# Altium footprint library SMotlaq-PCB_lib.PcbLib: 186 footprints (part 5 of 12)
Each footprint in its own frame and in the unit in brackets; x right, y up, seen from the top. Pads: shape width x height; smd on the part's side, far side on the other; paste and mask are expansions set on the pad; w line width, h text height; cw(c..) or ccw(c..) is an arc to the next point about the centre after c.
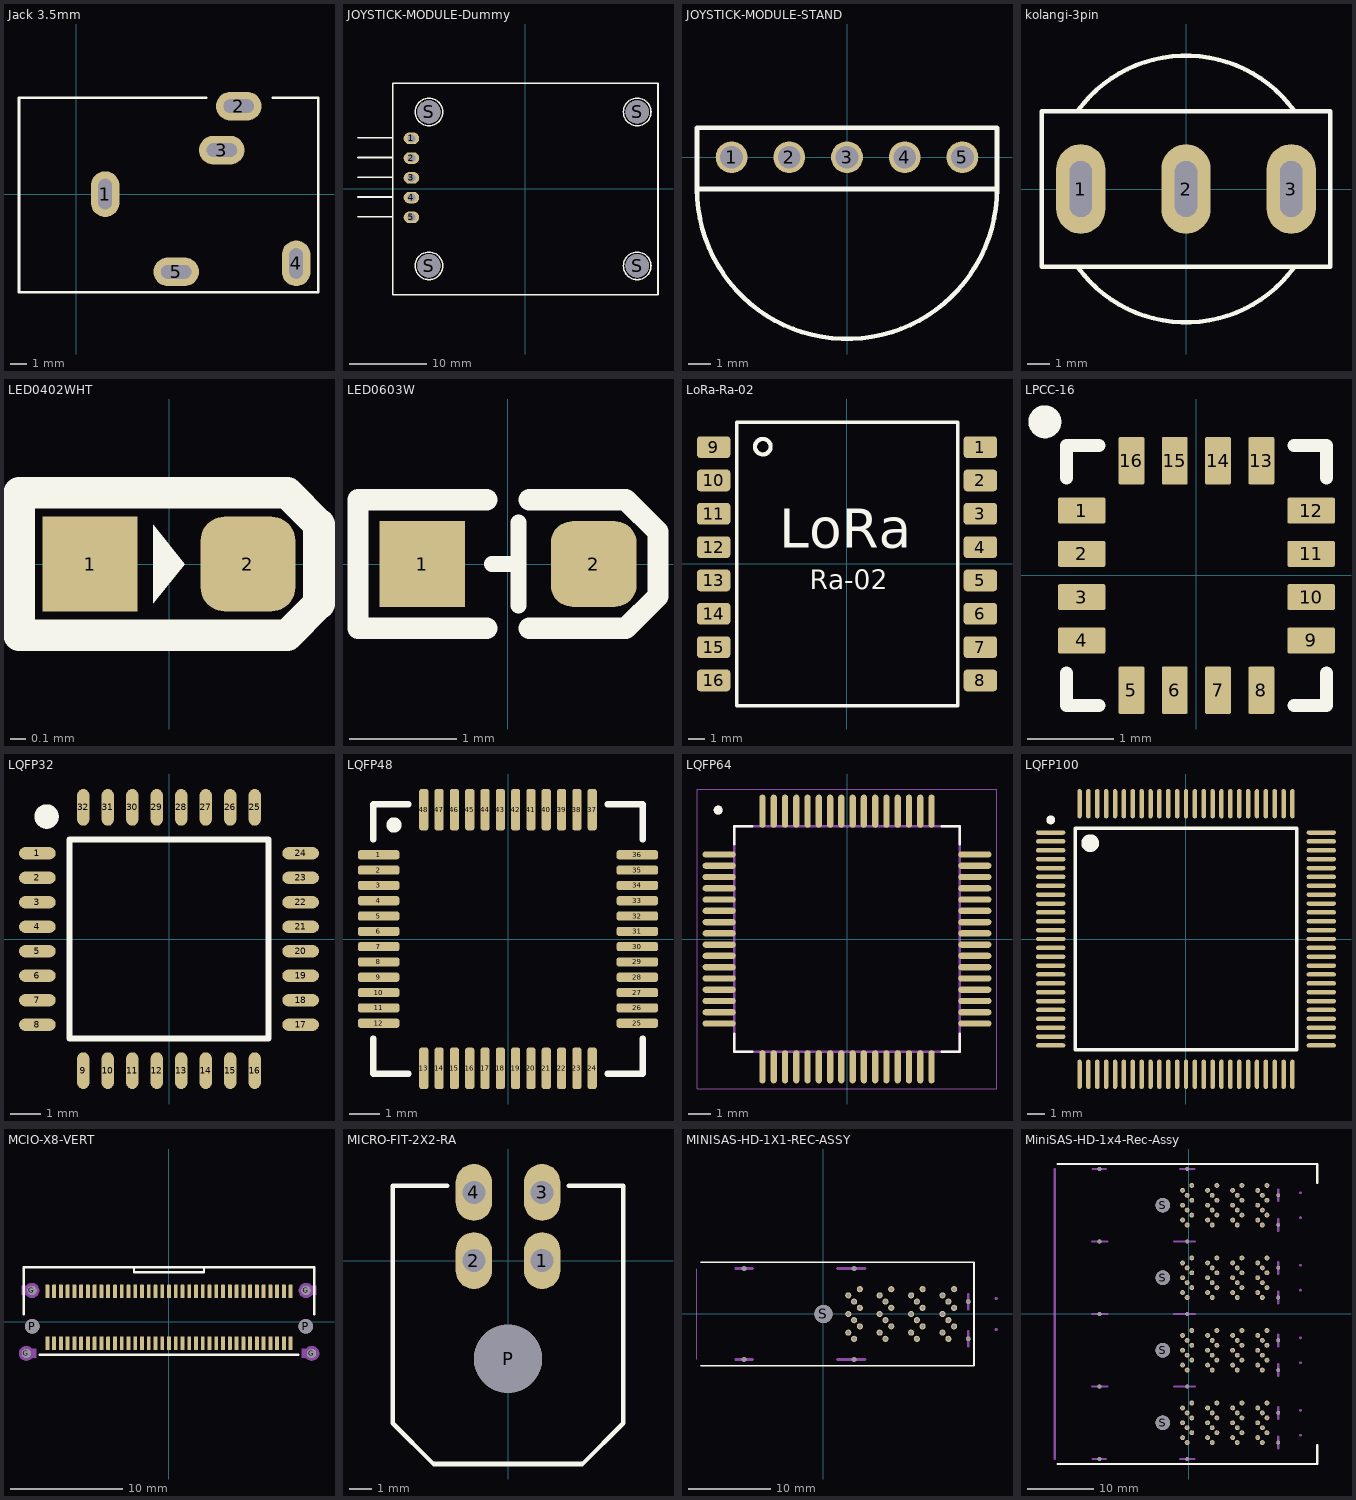
[diagram p4: the footprints below, top view; thin cyan lines are the x and y axes]

## Jack 3.5mm [mm]
pads (5):
  oval 1.7x2.7 hole 1.8 slot 0.8 at 0 deg: 1(1.7,0) 4(13,-4.1)
  oval 2.7x1.7 hole 1.8 slot 0.8 at 90 deg: 2(9.6,5.2) 3(8.6,2.6) 5(5.9,-4.6)
Top Overlay:
  lines w0.15: 7.675,5.7 -3.4,5.7 -3.4,-5.8 14.3,-5.8 14.3,5.7 11.625,5.7
3D body "User Library-StereoJack_3_5mm_Disi.step": height 6, standoff -3.2, extent -3.4,-5.8 14.3,5.7

## JOYSTICK-MODULE-Dummy [mm]
pads (9):
  oval 2x1.5 hole 1: 1(-14.65,6.5) 2(-14.65,3.96) 3(-14.65,1.42) 4(-14.65,-1.12) 5(-14.65,-3.66)
  round 3 hole 3 unplated: S(-12.4,-9.9) S(-12.4,9.9) S(14.4,-9.9) S(14.4,9.9)
Top Overlay:
  circle w0.2: c-12.4,-9.9 r1.773
  circle w0.2: c14.4,-9.9 r1.773
  circle w0.2: c14.4,9.9 r1.773
  circle w0.2: c-12.4,9.9 r1.773
  lines w0.2: -21.525,-3.58 -17.075,-3.58 ; -21.525,-1.04 -17.075,-1.04 ; -21.525,1.5 -17.075,1.5 ; -21.525,4.04 -17.075,4.04 ; -21.525,6.58 -17.075,6.58 ; -17.075,-13.6 -17.075,13.575 17.075,13.575 17.075,-13.6 -17.075,-13.6
3D body "Joystick HW504 Board.x_t": height 32.02, standoff 0, extent -22.5,-13.5 17,14

## JOYSTICK-MODULE-STAND [mm]
pads (5):
  round 1.4 / inner round 1.4 / far side rect 1.4x2.2 hole 1 mask+0.1: 1(-5.08,0)
  round 1.4 / inner round 1.4 / far side oval 1.4x2.2 hole 1 mask+0.1: 2(-2.54,0) 3(0,0) 4(2.54,0) 5(5.08,0)
Top Overlay:
  lines w0.2: -6.6,-1.4 ccw(c0,-1.4) 6.6,-1.4 ; -6.6,-1.4 -6.6,1.3 6.6,1.3 6.6,-1.4 ; -6.6,-1.4 6.6,-1.4
3D body "Joystick HW504 Board.x_t": height 42, standoff 2.5, extent -12.45,-26.249 15.05,5.775
3D body "female_header_a-bl254-eg-g02d.stp": height 8.5, standoff -3.2, extent 1.145,-1.3 6.475,1.2
3D body "female_header_a-bl254-eg-g03d.stp": height 8.5, standoff -3.2, extent -6.475,-1.3 1.395,1.2

## kolangi-3pin [mm]
pads (3):
  rrect100% 2.2x4 hole 1 slot 2.5 at 90 deg mask+0.075: 1(-4.7,0) 2(0,0) 3(4.7,0)
Top Overlay:
  lines w0.2: -4.822,-3.503 ccw(c0,0) 4.822,-3.503 ; -4.822,3.503 cw(c0,0) 4.822,3.503 ; -6.45,-3.475 -6.45,3.475 6.45,3.475 6.45,-3.475 -6.45,-3.475
3D body "User Library-SWITCH SPDT_O_N_O.STEP": height 28.89, standoff -2.17, extent -6.35,-5.968 6.35,5.968

## LED0402WHT [mm] "LED SMD 0402, WHITE"
pads (2):
  rect 0.6x0.6 smd paste-2 mask+0.075: 1(-0.5,0)
  rrect50% 0.6x0.6 smd paste-2 mask+0.075: 2(0.5,0)
Top Overlay:
  region: -0.1,0.25 -0.1,-0.25 0.1,0
  lines w0.2: -0.95,-0.45 -0.95,0.45 0.75,0.45 0.95,0.25 0.95,-0.25 0.75,-0.45 -0.95,-0.45
Top Paste:
  region: -0.3,0 -0.3,-0.05 -0.338,-0.142 -0.408,-0.212 -0.5,-0.25 -0.55,-0.25 -0.7,-0.25 -0.7,0.25 -0.55,0.25 -0.5,0.25 -0.408,0.212 -0.338,0.142 -0.3,0.05
  region: 0.3,0 0.3,-0.05 0.338,-0.142 0.408,-0.212 0.5,-0.25 0.55,-0.25 0.7,-0.25 0.7,0.25 0.55,0.25 0.5,0.25 0.408,0.212 0.338,0.142 0.3,0.05
3D body "LED_1006_W.STEP": height 0.2, standoff 0, extent -0.5,-0.3 0.5,0.3

## LED0603W [mm]
pads (2):
  rect 0.8x0.8 smd paste-5 mask+0.075: 1(-0.8,0)
  rrect50% 0.8x0.8 smd paste-5 mask+0.075: 2(0.8,0)
Top Overlay:
  lines w0.15: -0.15,0 0.1,0 ; 0.1,-0.387 0.1,0.387
  lines w0.2: -0.2,-0.6 -1.4,-0.6 -1.4,0.6 -0.2,0.6 ; 0.2,-0.6 1.1,-0.6 1.4,-0.3 1.4,0.3 1.1,0.6 0.2,0.6
Top Paste:
  region: 0.75,0.35 0.68,0.35 0.552,0.297 0.453,0.198 0.4,0.07 0.4,0 0.4,-0.07 0.453,-0.198 0.552,-0.297 0.68,-0.35 0.75,-0.35 0.95,-0.35 0.98,-0.35 1.035,-0.327 1.077,-0.285 1.1,-0.23 1.1,-0.2 1.1,0.2 1.1,0.23 1.077,0.285 1.035,0.327 0.98,0.35 0.95,0.35
  region: -0.75,0.35 -0.68,0.35 -0.552,0.297 -0.453,0.198 -0.4,0.07 -0.4,0 -0.4,-0.07 -0.453,-0.198 -0.552,-0.297 -0.68,-0.35 -0.75,-0.35 -0.95,-0.35 -0.98,-0.35 -1.035,-0.327 -1.077,-0.285 -1.1,-0.23 -1.1,-0.2 -1.1,0.2 -1.1,0.23 -1.077,0.285 -1.035,0.327 -0.98,0.35 -0.95,0.35
3D body: height 0.4, standoff 0, extent 0.6,-0.4 0.8,0.4
3D body: height 0.4, standoff 0, extent -0.8,-0.4 -0.6,0.4
3D body: height 0.4, standoff 0, extent -0.6,-0.4 0.6,0.4
3D body: height 0.5, standoff 0, extent -0.4,-0.3 0.4,0.3

## LoRa-Ra-02 [mm]
pads (16):
  rrect30% 2x1.3 smd: 1(8,7) 2(8,5) 3(8,3) 4(8,1) 5(8,-1) 6(8,-3) 7(8,-5) 8(8,-7) 9(-8,7) 10(-8,5) 11(-8,3) 12(-8,1) 13(-8,-1) 14(-8,-3) 15(-8,-5) 16(-8,-7)
Top Overlay:
  circle w0.254: c-5.05,7.025 r0.465
  lines w0.2: -6.625,-8.525 -6.625,8.5 6.65,8.5 6.65,-8.525 -6.625,-8.525
  text "Ra-02" at -2.25,-1.928 h2
  text "LoRa" at -4.05,0.191 h4
3D body "User Library-RA-02-2.STEP": height 3.2, standoff 0, extent -8,-8.5 8,8.5

## LPCC-16 [mm]
pads (16):
  rrect15% 0.55x0.3 smd: 1(-1.325,0.75) 2(-1.325,0.25) 3(-1.325,-0.25) 4(-1.325,-0.75) 9(1.325,-0.75) 10(1.325,-0.25) 11(1.325,0.25) 12(1.325,0.75)
  rrect15% 0.3x0.55 smd: 5(-0.75,-1.325) 6(-0.25,-1.325) 7(0.25,-1.325) 8(0.75,-1.325) 13(0.75,1.325) 14(0.25,1.325) 15(-0.25,1.325) 16(-0.75,1.325)
Top Overlay:
  circle w0.2: c-1.75,1.775 r0.09
  lines w0.15: -1.5,-1.125 -1.5,-1.5 -1.125,-1.5 ; -1.5,1.125 -1.5,1.5 -1.125,1.5 ; 1.125,-1.5 1.5,-1.5 1.5,-1.125 ; 1.125,1.5 1.5,1.5 1.5,1.125
3D body "User Library-LPCC 16.step": height 0.9, standoff 0, extent -1.5,-1.5 1.5,1.5

## LQFP32 [mm]
pads (32):
  rrect100% 1.2x0.4 smd: 1(-4.3,2.8) 2(-4.3,2) 3(-4.3,1.2) 4(-4.3,0.4) 5(-4.3,-0.4) 6(-4.3,-1.2) 7(-4.3,-2) 8(-4.3,-2.8) 17(4.3,-2.8) 18(4.3,-2) 19(4.3,-1.2) 20(4.3,-0.4) 21(4.3,0.4) 22(4.3,1.2) 23(4.3,2) 24(4.3,2.8)
  rrect100% 0.4x1.2 smd: 9(-2.8,-4.3) 10(-2,-4.3) 11(-1.2,-4.3) 12(-0.4,-4.3) 13(0.4,-4.3) 14(1.2,-4.3) 15(2,-4.3) 16(2.8,-4.3) 25(2.8,4.3) 26(2,4.3) 27(1.2,4.3) 28(0.4,4.3) 29(-0.4,4.3) 30(-1.2,4.3) 31(-2,4.3) 32(-2.8,4.3)
Top Overlay:
  circle w0.4: c-4,4 r0.2
  lines w0.2: -3.25,-3.25 3.25,-3.25 3.25,3.25 -3.25,3.25 -3.25,-3.25
3D body "User Library-LQFP32-0_8.step": height 1.65, standoff -0.01, extent -4.519,-4.519 4.519,4.519

## LQFP48 [mm]
pads (48):
  rrect50% 1.35x0.3 smd mask+0.1: 1(-4.225,2.75) 2(-4.225,2.25) 3(-4.225,1.75) 4(-4.225,1.25) 5(-4.225,0.75) 6(-4.225,0.25) 7(-4.225,-0.25) 8(-4.225,-0.75) 9(-4.225,-1.25) 10(-4.225,-1.75) 11(-4.225,-2.25) 12(-4.225,-2.75) 25(4.225,-2.75) 26(4.225,-2.25) 27(4.225,-1.75) 28(4.225,-1.25) 29(4.225,-0.75) 30(4.225,-0.25) 31(4.225,0.25) 32(4.225,0.75) 33(4.225,1.25) 34(4.225,1.75) 35(4.225,2.25) 36(4.225,2.75)
  rrect50% 0.3x1.35 smd mask+0.1: 13(-2.75,-4.225) 14(-2.25,-4.225) 15(-1.75,-4.225) 16(-1.25,-4.225) 17(-0.75,-4.225) 18(-0.25,-4.225) 19(0.25,-4.225) 20(0.75,-4.225) 21(1.25,-4.225) 22(1.75,-4.225) 23(2.25,-4.225) 24(2.75,-4.225) 37(2.75,4.225) 38(2.25,4.225) 39(1.75,4.225) 40(1.25,4.225) 41(0.75,4.225) 42(0.25,4.225) 43(-0.25,4.225) 44(-0.75,4.225) 45(-1.25,4.225) 46(-1.75,4.225) 47(-2.25,4.225) 48(-2.75,4.225)
Top Overlay:
  circle w0.3: c-3.725,3.725 r0.1
  lines w0.2: -4.4,-3.25 -4.4,-4.4 -3.25,-4.4 ; -4.4,3.25 -4.4,4.4 -3.25,4.4 ; 3.25,-4.4 4.4,-4.4 4.4,-3.25 ; 3.25,4.4 4.4,4.4 4.4,3.25
3D body "User Library-LQFP48-0_5.step": height 1.55, standoff -0.02, extent -4.386,-4.386 4.386,4.386

## LQFP64 [mm]
pads (64):
  rrect100% 1.47x0.28 smd: 1(-5.67,3.75) 2(-5.67,3.25) 3(-5.67,2.75) 4(-5.67,2.25) 5(-5.67,1.75) 6(-5.67,1.25) 7(-5.67,0.75) 8(-5.67,0.25) 9(-5.67,-0.25) 10(-5.67,-0.75) 11(-5.67,-1.25) 12(-5.67,-1.75) 13(-5.67,-2.25) 14(-5.67,-2.75) 15(-5.67,-3.25) 16(-5.67,-3.75) 33(5.67,-3.75) 34(5.67,-3.25) 35(5.67,-2.75) 36(5.67,-2.25) 37(5.67,-1.75) 38(5.67,-1.25) 39(5.67,-0.75) 40(5.67,-0.25) 41(5.67,0.25) 42(5.67,0.75) 43(5.67,1.25) 44(5.67,1.75) 45(5.67,2.25) 46(5.67,2.75) 47(5.67,3.25) 48(5.67,3.75)
  rrect100% 0.28x1.47 smd: 17(-3.75,-5.67) 18(-3.25,-5.67) 19(-2.75,-5.67) 20(-2.25,-5.67) 21(-1.75,-5.67) 22(-1.25,-5.67) 23(-0.75,-5.67) 24(-0.25,-5.67) 25(0.25,-5.67) 26(0.75,-5.67) 27(1.25,-5.67) 28(1.75,-5.67) 29(2.25,-5.67) 30(2.75,-5.67) 31(3.25,-5.67) 32(3.75,-5.67) 49(3.75,5.67) 50(3.25,5.67) 51(2.75,5.67) 52(2.25,5.67) 53(1.75,5.67) 54(1.25,5.67) 55(0.75,5.67) 56(0.25,5.67) 57(-0.25,5.67) 58(-0.75,5.67) 59(-1.25,5.67) 60(-1.75,5.67) 61(-2.25,5.67) 62(-2.75,5.67) 63(-3.25,5.67) 64(-3.75,5.67)
Top Overlay:
  circle w0.2: c-5.715,5.715 r0.1
  lines w0.127: -5,-4.21 -5,-5 -4.21,-5 ; -5,4.21 -5,5 -4.21,5 ; 4.21,-5 5,-5 5,-4.21 ; 4.21,5 5,5 5,4.21
Mechanical 13:
  circle w0.2: c-5.715,5.715 r0.1
  lines w0.127: -5,-5 -5,5 5,5 5,-5 -5,-5
Mechanical 15:
  lines w0.05: -6.655,-6.655 -6.655,6.655 6.655,6.655 6.655,-6.655 -6.655,-6.655
3D body "User Library-STM32Fxxx -LQFP64 10mm x 10mm.step": height 1.6, standoff 0.01, extent -5.999,-5.999 5.999,5.999

## LQFP100 [mm]
pads (100):
  rrect100% 1.655x0.252 smd paste+0: 1(-7.618,6.002) 2(-7.618,5.502) 3(-7.618,5.002) 4(-7.618,4.502) 5(-7.618,4.002) 6(-7.618,3.502) 7(-7.618,3.002) 8(-7.618,2.502) 9(-7.618,2.002) 10(-7.618,1.502) 11(-7.618,1.002) 12(-7.618,0.502) 13(-7.618,0.002) 14(-7.618,-0.498) 15(-7.618,-0.998) 16(-7.618,-1.498) 17(-7.618,-1.998) 18(-7.618,-2.498) 19(-7.618,-2.998) 20(-7.618,-3.498) 21(-7.618,-3.998) 22(-7.618,-4.498) 23(-7.618,-4.998) 24(-7.618,-5.498) 25(-7.618,-5.998) 51(7.633,-5.998) 52(7.633,-5.498) 53(7.633,-4.998) 54(7.633,-4.498) 55(7.633,-3.998) 56(7.633,-3.498) 57(7.633,-2.998) 58(7.633,-2.498) 59(7.633,-1.998) 60(7.633,-1.498) 61(7.633,-0.998) 62(7.633,-0.498) 63(7.633,0.002) 64(7.633,0.502) 65(7.633,1.002) 66(7.633,1.502) 67(7.633,2.002) 68(7.633,2.502) 69(7.633,3.002) 70(7.633,3.502) 71(7.633,4.002) 72(7.633,4.502) 73(7.633,5.002) 74(7.633,5.502) 75(7.633,6.002)
  rrect100% 0.252x1.655 smd paste+0: 26(-5.992,-7.623) 27(-5.492,-7.623) 28(-4.992,-7.623) 29(-4.492,-7.623) 30(-3.992,-7.623) 31(-3.492,-7.623) 32(-2.992,-7.623) 33(-2.492,-7.623) 34(-1.992,-7.623) 35(-1.492,-7.623) 36(-0.992,-7.623) 37(-0.492,-7.623) 38(0.008,-7.623) 39(0.508,-7.623) 40(1.008,-7.623) 41(1.508,-7.623) 42(2.008,-7.623) 43(2.508,-7.623) 44(3.008,-7.623) 45(3.508,-7.623) 46(4.008,-7.623) 47(4.508,-7.623) 48(5.008,-7.623) 49(5.508,-7.623) 50(6.008,-7.623) 76(6.008,7.628) 77(5.508,7.628) 78(5.008,7.628) 79(4.508,7.628) 80(4.008,7.628) 81(3.508,7.628) 82(3.008,7.628) 83(2.508,7.628) 84(2.008,7.628) 85(1.508,7.628) 86(1.008,7.628) 87(0.508,7.628) 88(0.008,7.628) 89(-0.492,7.628) 90(-0.992,7.628) 91(-1.492,7.628) 92(-1.992,7.628) 93(-2.492,7.628) 94(-2.992,7.628) 95(-3.492,7.628) 96(-3.992,7.628) 97(-4.492,7.628) 98(-4.992,7.628) 99(-5.492,7.628) 100(-5.992,7.628)
Top Overlay:
  circle w0.5: c-5.392,5.402 r0.25
  circle w0.25: c-7.618,6.712 r0.125
  lines w0.2: -6.242,-6.248 -6.242,6.252 6.258,6.252 6.258,-6.248 -6.242,-6.248
3D body "IC_STMicroelectronics_STM32L496VGT6_eec.STEP": height 1.6, standoff 0, extent -7.992,-7.998 8.008,8.002

## MCIO-X8-VERT [mm]
pads (80):
  rrect20% 0.35x1.2 smd mask+0.1: A1(-10.8,-1.895) A2(-10.2,-1.895) A3(-9.6,-1.895) A4(-9,-1.895) A5(-8.4,-1.895) A6(-7.8,-1.895) A7(-7.2,-1.895) A8(-6.6,-1.895) A9(-6,-1.895) A10(-5.4,-1.895) A11(-4.8,-1.895) A12(-4.2,-1.895) A13(-3.6,-1.895) A14(-3,-1.895) A15(-2.4,-1.895) A16(-1.8,-1.895) A17(-1.2,-1.895) A18(-0.6,-1.895) A19(0,-1.895) A20(0.6,-1.895) A21(1.2,-1.895) A22(1.8,-1.895) A23(2.4,-1.895) A24(3,-1.895) A25(3.6,-1.895) A26(4.2,-1.895) A27(4.8,-1.895) A28(5.4,-1.895) A29(6,-1.895) A30(6.6,-1.895) A31(7.2,-1.895) A32(7.8,-1.895) A33(8.4,-1.895) A34(9,-1.895) A35(9.6,-1.895) A36(10.2,-1.895) A37(10.8,-1.895) B1(-10.8,2.705) B2(-10.2,2.705) B3(-9.6,2.705) B4(-9,2.705) B5(-8.4,2.705) B6(-7.8,2.705) B7(-7.2,2.705) B8(-6.6,2.705) B9(-6,2.705) B10(-5.4,2.705) B11(-4.8,2.705) B12(-4.2,2.705) B13(-3.6,2.705) B14(-3,2.705) B15(-2.4,2.705) B16(-1.8,2.705) B17(-1.2,2.705) B18(-0.6,2.705) B19(0,2.705) B20(0.6,2.705) B21(1.2,2.705) B22(1.8,2.705) B23(2.4,2.705) B24(3,2.705) B25(3.6,2.705) B26(4.2,2.705) B27(4.8,2.705) B28(5.4,2.705) B29(6,2.705) B30(6.6,2.705) B31(7.2,2.705) B32(7.8,2.705) B33(8.4,2.705) B34(9,2.705) B35(9.6,2.705) B36(10.2,2.705) B37(10.8,2.705)
  round 0.8 hole 0.8 unplated mask+0.1: G(-12.675,-2.795) G(-12.175,2.795) G(12.175,2.795) G(12.675,-2.795)
  round 1.3 hole 1.3 unplated mask+0.1: P(-12.15,-0.395) P(12.15,-0.395)
Top Overlay:
  lines w0.2: -12.9,0.655 -12.9,4.855 12.9,4.855 12.9,0.655 ; -11.5,-2.92 11.5,-2.92 ; -3.1,4.855 -3.1,4.405 0,4.405 3.1,4.405 3.1,4.855
Mechanical 29:
  drawing of 12 lines, arcs and shapes, not listed
3D body "g97vx2x1xhr.stp": height 8.95, standoff -1.95, extent -12.9,-2.93 12.9,4.84

## MICRO-FIT-2X2-RA [mm]
height 8.77
pads (5):
  oval 1.6x2.5 hole 1.02 mask+0.1: 1(1.5,0) 2(-1.5,0) 3(1.5,3) 4(-1.5,3)
  round 3 hole 3 unplated mask+0.1: P(0,-4.32)
Top Overlay:
  lines w0.2: -2.675,3.3 -5.075,3.3 -5.075,-7.15 -3.275,-8.95 3.275,-8.95 5.075,-7.15 5.075,3.3 2.675,3.3
3D body "0430450400.stp": height 8.83, standoff -3.12, extent -5.075,-8.955 5.075,3.285

## MINISAS-HD-1X1-REC-ASSY [mm]
pads (43):
  round 0.74 hole 0.457 mask+0.05: A1(4.4,3) A2(3,2.25) A3(3.7,1.5) A4(4.4,0.75) A5(3,0) A6(3.7,-0.75) A7(4.4,-1.5) A8(3,-2.25) A9(3.7,-3) B1(8.2,3) B2(6.8,2.25) B3(7.5,1.5) B4(8.2,0.75) B5(6.8,0) B6(7.5,-0.75) B7(8.2,-1.5) B8(6.8,-2.25) B9(7.5,-3) C1(12,3) C2(10.6,2.25) C3(11.3,1.5) C4(12,0.75) C5(10.6,0) C6(11.3,-0.75) C7(12,-1.5) C8(10.6,-2.25) C9(11.3,-3) D1(15.8,3) D2(14.4,2.25) D3(15.1,1.5) D4(15.8,0.75) D5(14.4,0) D6(15.1,-0.75) D7(15.8,-1.5) D8(14.4,-2.25) D9(15.1,-3)
  round 0.57 hole 0.57 mask+0.1: P(-9.61,-5.5) P(-9.61,5.5) P(3.7,-5.5) P(3.7,5.5) P(17.51,-3) P(17.51,1.5)
  round 2.2 hole 2.2 unplated mask+1.1: S(0,0)
Top Overlay:
  lines w0.2: -14.825,-6.25 18.2,-6.25 18.2,6.25 -14.825,6.25
Mechanical 1:
  lines w0.35: -10.61,-5.5 -9.61,-5.5 -8.61,-5.5 ; -10.61,5.5 -9.61,5.5 -8.61,5.5 ; 1.7,-5.5 3.7,-5.5 5,-5.5 ; 1.7,5.5 3.7,5.5 5,5.5 ; 17.51,-3.875 17.51,-3 17.51,-2.125 ; 17.51,0.625 17.51,1.5 17.51,2.375
Mechanical 13:
  circle w0.2: c20.89,1.88 r0.1
  circle w0.2: c20.89,-1.88 r0.1
  lines w0.1: -15.3,-5.5 -15.3,5.5
  text "PCB Edge" at -15.768,-2.034 h1
3D body "2274215-1.stp": height 12.82, standoff -2.45, extent -20.35,-6.255 17.65,6.255

## MiniSAS-HD-1x4-Rec-Assy [mm]
pads (166):
  round 0.74 hole 0.457 mask+0.05: A1(0.45,-13.5) A2(-0.95,-14.25) A3(-0.25,-15) A4(0.45,-15.75) A5(-0.95,-16.5) A6(-0.25,-17.25) A7(0.45,-18) A8(-0.95,-18.75) A9(-0.25,-19.5) B1(4.25,-13.5) B2(2.85,-14.25) B3(3.55,-15) B4(4.25,-15.75) b5(2.85,-16.5) B6(3.55,-17.25) B7(4.25,-18) B8(2.85,-18.75) B9(3.55,-19.5) C1(8.05,-13.5) C2(6.65,-14.25) C3(7.35,-15) C4(8.05,-15.75) C5(6.65,-16.5) C6(7.35,-17.25) C7(8.05,-18) C8(6.65,-18.75) C9(7.35,-19.5) D1(11.85,-13.5) D2(10.45,-14.25) D3(11.15,-15) D4(11.85,-15.75) D5(10.45,-16.5) D6(11.15,-17.25) D7(11.85,-18) D8(10.45,-18.75) D9(11.15,-19.5) E1(0.45,-2.5) E2(-0.95,-3.25) E3(-0.25,-4) E4(0.45,-4.75) E5(-0.95,-5.5) E6(-0.25,-6.25) E7(0.45,-7) E8(-0.95,-7.75) E9(-0.25,-8.5) F1(4.25,-2.5) F2(2.85,-3.25) F3(3.55,-4) F4(4.25,-4.75) F5(2.85,-5.5) F6(3.55,-6.25) F7(4.25,-7) F8(2.85,-7.75) F9(3.55,-8.5) G1(8.05,-2.5) G2(6.65,-3.25) G3(7.35,-4) G4(8.05,-4.75) G5(6.65,-5.5) G6(7.35,-6.25) G7(8.05,-7) G8(6.65,-7.75) G9(7.35,-8.5) H1(11.85,-2.5) H2(10.45,-3.25) H3(11.15,-4) H4(11.85,-4.75) H5(10.45,-5.5) H6(11.15,-6.25) H7(11.85,-7) H8(10.45,-7.75) H9(11.15,-8.5) I1(0.45,8.5) I2(-0.95,7.75) I3(-0.25,7) I4(0.45,6.25) I5(-0.95,5.5) I6(-0.25,4.75) I7(0.45,4) I8(-0.95,3.25) I9(-0.25,2.5) J1(4.25,8.5) J2(2.85,7.75) J3(3.55,7) J4(4.25,6.25) J5(2.85,5.5) J6(3.55,4.75) J7(4.25,4) J8(2.85,3.25) J9(3.55,2.5) K1(8.05,8.5) K2(6.65,7.75) K3(7.35,7) K4(8.05,6.25) K5(6.65,5.5) K6(7.35,4.75) K7(8.05,4) K8(6.65,3.25) K9(7.35,2.5) L1(11.85,8.5) L2(10.45,7.75) L3(11.15,7) L4(11.85,6.25) L5(10.45,5.5) L6(11.15,4.75) L7(11.85,4) L8(10.45,3.25) L9(11.15,2.5) M1(0.45,19.5) M2(-0.95,18.75) M3(-0.25,18) M4(0.45,17.25) M5(-0.95,16.5) M6(-0.25,15.75) M7(0.45,15) M8(-0.95,14.25) M9(-0.25,13.5) N1(4.25,19.5) N2(2.85,18.75) N3(3.55,18) N4(4.25,17.25) N5(2.85,16.5) N6(3.55,15.75) N7(4.25,15) N8(2.85,14.25) N9(3.55,13.5) O1(8.05,19.5) O2(6.65,18.75) O3(7.35,18) O4(8.05,17.25) O5(6.65,16.5) O6(7.35,15.75) O7(8.05,15) O8(6.65,14.25) O9(7.35,13.5) P1(11.85,19.5) P2(10.45,18.75) P3(11.15,18) P4(11.85,17.25) P5(10.45,16.5) P6(11.15,15.75) P7(11.85,15) P8(10.45,14.25) P9(11.15,13.5)
  round 0.57 hole 0.57 unplated mask+0.1: P(-13.56,-22) P(-13.56,-11) P(-13.56,0) P(-13.56,11) P(-13.56,22) P(-0.25,-22) P(-0.25,-11) P(-0.25,0) P(-0.25,11) P(-0.25,22) P(13.56,-19.5) P(13.56,-15) P(13.56,-8.5) P(13.56,-4) P(13.56,2.5) P(13.56,7) P(13.56,13.5) P(13.56,18)
  round 2.2 hole 2.2 unplated mask+1.1: S(-3.95,-16.5) S(-3.95,-5.5) S(-3.95,5.5) S(-3.95,16.5)
Top Overlay:
  lines w0.35: -19.925,-22.75 19.475,-22.75 19.475,-19.9 ; -19.925,22.75 19.475,22.75 19.475,19.9
Mechanical 1:
  lines w0.35: -14.66,-11 -13.56,-11 -12.36,-11 ; -14.66,0 -13.56,0 -12.36,0 ; -14.66,11 -13.56,11 -12.36,11 ; -14.56,-22 -13.56,-22 -12.56,-22 ; -14.56,22 -13.56,22 -12.56,22 ; -2.25,-11 -0.25,-11 0.95,-11 ; -2.25,0 -0.25,0 0.95,0 ; -2.25,11 -0.25,11 0.95,11 ; -1.35,-22 -0.25,-22 0.85,-22 ; -1.35,22 -0.25,22 0.85,22 ; 13.56,-20.375 13.56,-19.5 13.56,-18.625 ; 13.56,-15.875 13.56,-15 13.56,-14.125 ; 13.56,-9.375 13.56,-8.5 13.56,-7.625 ; 13.56,-4.875 13.56,-4 13.56,-3.125 ; 13.56,1.625 13.56,2.5 13.56,3.375 ; 13.56,6.125 13.56,7 13.56,7.875 ; 13.56,12.625 13.56,13.5 13.56,14.375 ; 13.56,17.125 13.56,18 13.56,18.875
Mechanical 4:
  lines w0.35: -20.33,-22 -20.33,22
  text "PCB Edge" at -19.649,-13.925 h2
  text "PCB Edge" at -19.649,22.1 h2
Mechanical 13:
  circle w0.2: c16.94,-18.38 r0.1
  circle w0.2: c16.94,-14.62 r0.1
  circle w0.2: c16.94,-7.38 r0.1
  circle w0.2: c16.94,-3.62 r0.1
  circle w0.2: c16.94,3.62 r0.1
  circle w0.2: c16.94,7.38 r0.1
  circle w0.2: c16.94,14.62 r0.1
  circle w0.2: c16.94,18.38 r0.1
3D body "c-2180736-1-b-3d.stp": height 16.49, standoff -2.35, extent -24.3,-22.755 19.48,22.755